# Altium footprint library PcbLib1.PcbLib: 42 footprints (part 2 of 3)
Each footprint in its own frame and in the unit in brackets; x right, y up, seen from the top. Pads: shape width x height; smd on the part's side, far side on the other; paste and mask are expansions set on the pad; w line width, h text height; cw(c..) or ccw(c..) is an arc to the next point about the centre after c.
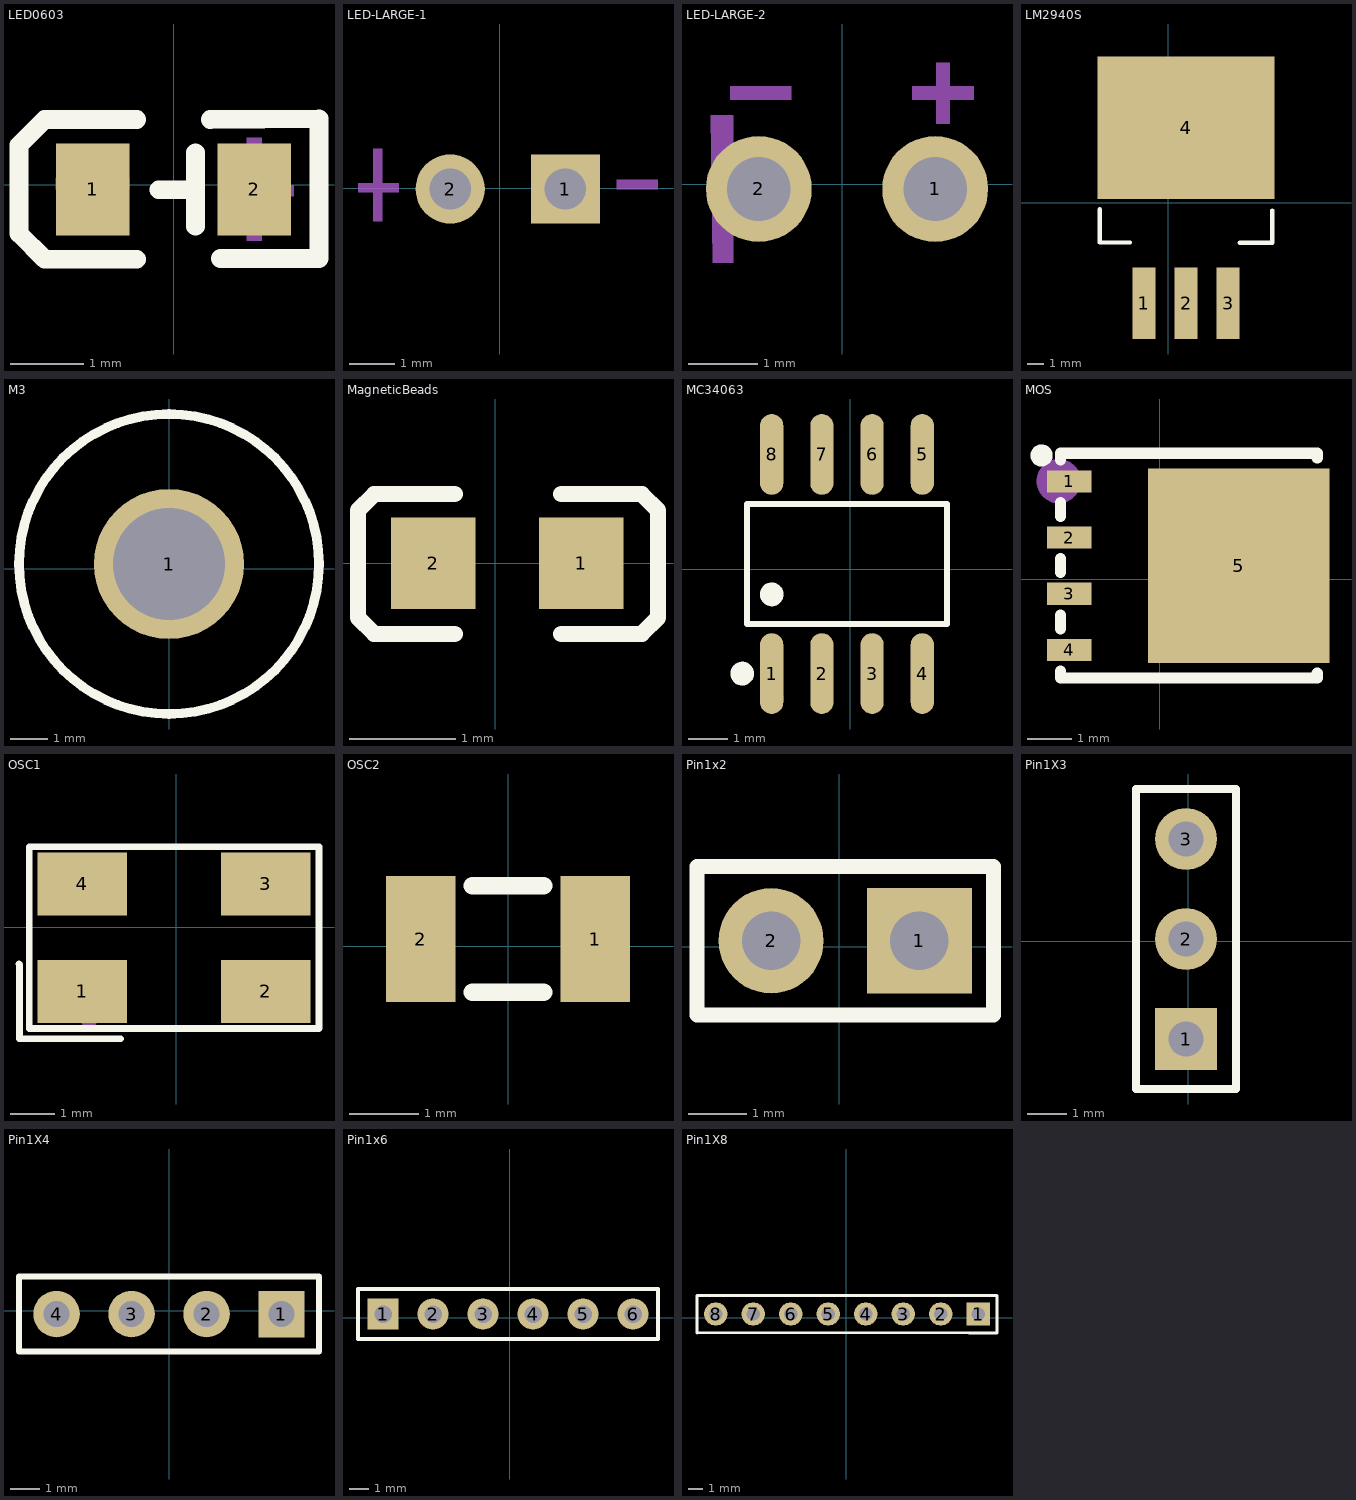
[diagram p1: the footprints below, top view; thin cyan lines are the x and y axes]

## LED0603 [mm]
pads (2):
  rect 1x1.25 smd: 1(-1.104,-0.061) 2(1.096,-0.061)
Top Overlay:
  lines w0.254: -0.504,-1.011 -1.754,-1.011 ; -0.504,0.889 -1.754,0.889 ; -0.204,-0.066 0.296,-0.066 ; 0.296,-0.561 0.296,0.439 ; 0.496,0.889 1.976,0.899 1.976,-1.001 0.636,-1.001 ; -1.754,-1.011 -2.104,-0.661 -2.104,0.539 -1.754,0.889 ; -1.754,-1.011 -1.754,-1.011 ; -1.754,0.889 -1.754,0.889
Mechanical 15:
  region: -1.604,-0.061 -0.604,-0.061 -0.604,0.089 -1.604,0.089
  region: 0.631,-0.155 1.631,-0.155 1.631,-0.005 0.631,-0.005
  region: 0.996,0.639 1.196,0.639 1.196,-0.761 0.996,-0.761
3D body "LED3.step": height 1.01, standoff 0, extent -1.01,-0.752 1.01,0.508

## LED-LARGE-1 [mil]
pads (2):
  rect 60x60 hole 36: 1(56.95,-0.6)
  round 60 hole 36: 2(-43.05,-0.6)
Bottom Overlay:
  circle w7.87: c6.95,-0.6 r86.61
  region: -87.46,4.91 -122.89,4.91 -122.89,-2.97 -87.46,-2.97
  region: 137.25,7.56 101.82,7.56 101.82,-0.32 137.25,-0.32
  region: -102.02,34.56 -109.89,34.56 -109.89,-28.43 -102.02,-28.43
  lines w10: -18.05,49.4 -18.05,64.4 ; -3.05,64.4 -8.05,64.4 -18.05,64.4 ; 1.95,44.4 -18.05,64.4 ; 16.95,49.4 16.95,64.4 ; 31.95,64.4 26.95,64.4 16.95,64.4 ; 36.95,44.4 16.95,64.4
Mechanical 15:
  region: -101.84,34.28 -109.71,34.28 -109.71,-28.71 -101.84,-28.71
  region: -87.62,4.46 -123.05,4.46 -123.05,-3.42 -87.62,-3.42
  region: 136.87,7.27 101.44,7.27 101.44,-0.6 136.87,-0.6
3D body "LED_LARGE1.step": height 216.53, standoff -137.8, extent -57.45,-71.77 84.22,81.56

## LED-LARGE-2 [mil]
pads (2):
  round 60 hole 36: 1(52.71,-2.7) 2(-47.29,-2.7)
Bottom Overlay:
  lines w10: -69.36,29.56 -69.36,42.37 cw(c2.7,-2.7) 83.97,22.22 ; -68.52,-35.52 -68.37,-47.12 ccw(c2.71,-2.7) 82.71,-27.7 ; -44.65,32.54 cw(c2.7,-2.7) 47.82,35.37 ; -42.52,-40.74 ccw(c2.71,-2.7) 48.9,-39.55
Mechanical 15:
  region: -61.86,39.03 -61.86,-44.43 -73.28,-44.43 -73.28,-44.04 -74.46,39.03
  region: 39.81,55.41 74.46,55.41 74.46,47.93 39.81,47.93
  region: 60.86,68.97 60.86,34.33 53.38,34.33 53.38,68.97
  region: -63.44,55.41 -28.79,55.41 -28.79,47.93 -63.44,47.93
3D body "LED_LARGE2.step": height 216.53, standoff -137.8, extent -66.62,-79.46 75.05,73.87

## LM2940S [mm]
pads (4):
  rect 1.4x4.3 smd: 1(-1.466,-6.073) 2(1.074,-6.073) 3(3.614,-6.073)
  rect 10.7x8.6 smd: 4(1.074,4.527)
Top Overlay:
  lines w0.254: -4.126,-0.393 -4.126,-2.393 -2.306,-2.393 ; 4.314,-2.413 6.274,-2.413 6.274,-0.473
Mechanical 15:
  circle w0.6: c-1.446,-7.553 r0.3
3D body "LM2940S.step": height 4.5, standoff 0, extent -4.053,-6.568 6.147,7.66

## M3 [mm]
pads (1):
  round 4 hole 3: 1(0,0.127)
Top Overlay:
  circle w0.254: c0,0.127 r4
3D body: height 10, standoff 0, extent -2.54,-2.41 2.54,2.664

## MagneticBeads [mm]
pads (2):
  rect 0.8x0.864 smd: 1(0.816,0) 2(-0.584,0)
Top Overlay:
  lines w0.152: -0.381,-0.67 -1.143,-0.67 -1.295,-0.517 -1.295,0.499 -1.143,0.652 -0.381,0.652 ; 0.625,-0.67 1.387,-0.67 1.54,-0.517 1.54,0.499 1.387,0.652 0.625,0.652
Top Paste:
  region: -0.148,-0.154 -0.148,0.122 -0.423,0.416 -0.926,0.416 -0.99,0.352 -0.99,-0.384 -0.926,-0.448 -0.423,-0.448
  region: 0.367,-0.143 0.367,0.134 0.642,0.427 1.145,0.427 1.209,0.363 1.209,-0.373 1.145,-0.437 0.642,-0.437
3D body "L3.step": height 0.5, standoff 0, extent -0.67,-0.384 0.93,0.416

## MC34063 [mm]
pads (8):
  oval 0.588x2.045 smd: 1(-1.981,-2.639) 2(-0.711,-2.639) 3(0.559,-2.639) 4(1.829,-2.639) 5(1.829,2.906) 6(0.559,2.906) 7(-0.711,2.906) 8(-1.981,2.906)
Top Overlay:
  circle w0.3: c-1.981,-0.635 r0.15
  circle w0.3: c-2.728,-2.639 r0.15
  lines w0.152: -2.602,-1.388 -2.602,1.655 2.45,1.655 2.45,-1.388 -2.602,-1.388
Mechanical 15:
  circle w0.3: c-1.981,-3.266 r0.15
3D body "MC34063.step": height 1.72, standoff 0, extent -2.461,-2.809 2.354,3.191

## MOS [mm]
pads (6):
  rect 1x0.5 smd: 1(-2.051,2.21) 2(-2.051,0.94) 3(-2.051,-0.33) 4(-2.051,-1.6)
  round 0 smd: 5(1.499,0.305)
  rect 4.1x4.4 smd: 5(1.778,0.305)
Top Overlay:
  circle w0.25: c-2.677,2.795 r0.125
  lines w0.254: -2.246,-2.081 -2.246,-2.235 -1.891,-2.235 ; -2.246,-1.119 -2.246,-0.811 ; -2.246,0.151 -2.246,0.459 ; -2.246,1.421 -2.246,1.729 ; -2.246,2.691 -2.246,2.845 -1.891,2.845 3.189,2.845 3.554,2.845 3.554,2.736 ; 3.554,-2.126 3.554,-2.235 3.189,-2.235 ; 3.554,-1.064 3.554,-0.826 ; 3.554,0.136 3.554,0.474 ; 3.554,1.436 3.554,1.674 ; -1.891,-2.235 -1.891,-2.235 ; -1.891,-2.235 3.189,-2.235 ; 3.189,-2.235 3.189,-2.235
Top Paste:
  region: -2.551,-1.35 -1.551,-1.35 -1.551,-1.85 -2.551,-1.85
  region: -2.551,-0.08 -1.551,-0.08 -1.551,-0.58 -2.551,-0.58
  region: -2.551,1.19 -1.551,1.19 -1.551,0.69 -2.551,0.69
  region: -2.551,2.46 -1.551,2.46 -1.551,1.96 -2.551,1.96
Mechanical 15:
  circle w0.5: c-2.286,2.215 r0.25
3D body "Q4.step": height 1.11, standoff 0, extent -2.236,-2.155 3.584,2.765

## OSC1 [mm]
pads (4):
  rect 2x1.4 smd: 1(-2.101,-1.429) 2(1.999,-1.429) 3(1.999,0.971) 4(-2.101,0.971)
Top Overlay:
  lines w0.152: -3.514,-0.819 -3.505,-0.828 -3.505,-2.487 -3.307,-2.487 -1.25,-2.487 ; -3.287,-2.258 -3.287,1.801 3.185,1.801 3.185,-2.258 -3.078,-2.258 -3.287,-2.258
Mechanical 15:
  circle w0.2: c-1.951,-2.029 r0.1
3D body "X2.step": height 1.12, standoff 0, extent -2.5,-1.728 2.5,1.473

## OSC2 [mm]
pads (2):
  rect 1x1.8 smd: 1(1.245,0.102) 2(-1.255,0.102)
Top Overlay:
  lines w0.254: -0.513,-0.66 0.503,-0.66 ; -0.513,0.864 0.503,0.864
3D body "X1.step": height 0.76, standoff 0, extent -1.6,-0.623 1.601,0.877
3D body: height 0.25, standoff 0, extent -0.572,1.397 -0.572,1.397

## PCBComponent_1 [mil]

## Pin1x2 [mm]
pads (2):
  rect 1.8x1.8 hole 1 mask+0.051: 1(1.373,0.107)
  round 1.8 hole 1 mask+0.051: 2(-1.167,0.107)
Top Overlay:
  lines w0.254: -2.437,-1.163 -2.437,1.377 2.643,1.377 2.643,-1.163 -2.437,-1.163
Mechanical 15:
  region: -0.847,-0.213 -1.487,-0.213 -1.487,0.427 -0.847,0.427
  region: 1.693,-0.213 1.053,-0.213 1.053,0.427 1.693,0.427
  region: 2.703,1.377 2.703,1.402 2.668,1.437 2.619,1.437 2.583,1.402 2.583,1.377 2.583,1.352 2.619,1.317 2.668,1.317 2.703,1.352 2.703,1.377
  lines w0.051: -2.437,-1.163 -2.437,1.377 2.643,1.377 2.643,-1.163 -2.437,-1.163
3D body "Pin1X2.step": height 7.82, standoff -2.72, extent -2.23,-1.072 2.432,1.255

## Pin1X3 [mil]
pads (3):
  rect 62x62 hole 35: 1(-2.14,-98)
  round 62 hole 35: 2(-2.14,2) 3(-2.14,102)
Top Overlay:
  lines w7.99: 47.86,-73 47.86,152
  lines w8: 47.86,-73 47.86,-148 -52.14,-148 -52.14,152 47.86,152
3D body "J7.step": height 334.65, standoff -118.11, extent -52.15,-147.99 47.85,152.01

## Pin1X4 [mil]
pads (4):
  rect 62x62 hole 35: 1(149.41,-4.14)
  round 62 hole 35: 2(49.41,-4.14) 3(-50.59,-4.14) 4(-150.59,-4.14)
Top Overlay:
  lines w7.99: -200.59,-54.14 124.41,-54.14
  lines w8: -200.59,-54.14 -200.59,45.86 199.41,45.86 199.41,-54.14 124.41,-54.14
3D body "J14.step": height 334.65, standoff -118.11, extent -204.99,-54.14 195.01,45.86

## Pin1x6 [mil]
pads (6):
  rect 62x62 hole 35: 1(-253.74,7.86)
  round 62 hole 35: 2(-153.74,7.86) 3(-53.74,7.86) 4(46.26,7.86) 5(146.26,7.86) 6(246.26,7.86)
Top Overlay:
  lines w7.99: -228.74,57.86 296.26,57.86
  lines w8: -228.74,57.86 -303.74,57.86 -303.74,-42.14 296.26,-42.14 296.26,57.86
3D body "J15.step": height 334.65, standoff -118.11, extent -304.99,-44.99 295.04,55.01
3D body: height 10, standoff 0, extent 0,125 0,125

## Pin1X8 [mil]
pads (8):
  rect 62x62 hole 35: 1(352,10)
  round 62 hole 35: 2(252,10) 3(152,10) 4(52,10) 5(-48,10) 6(-148,10) 7(-248,10) 8(-348,10)
Top Overlay:
  lines w7.99: -398,-40 327,-40
  lines w8: -398,-40 -398,60 402,60 402,-40 327,-40
3D body "H1.step": height 332.76, standoff -120, extent -395,-40 405,60